# Altium integrated library SFMproject.IntLib: 182 symbols (continued)
## CP2110-F01-GMR (continued)
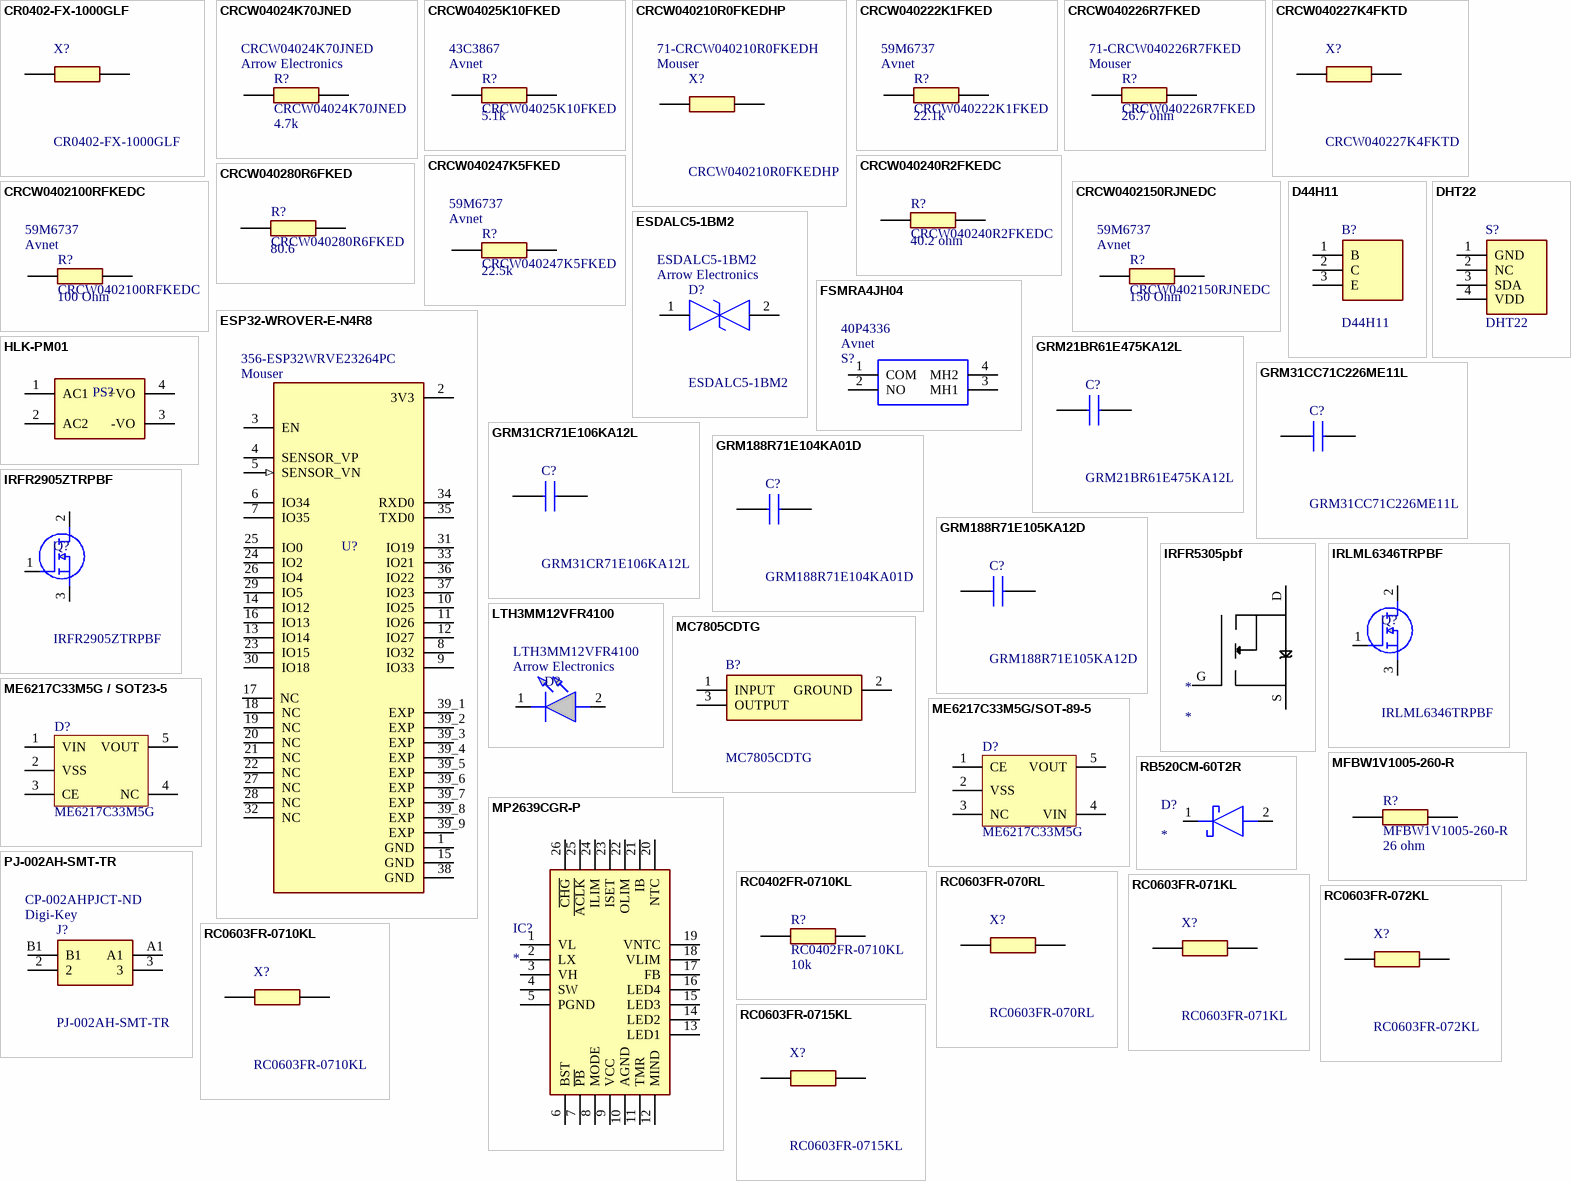
[diagram p3: symbols CR0402-FX-1000GLF to RC0603FR-0715KL]

## CR0402-FX-1000GLF
designator X?
SMD 0402 thick film resistor 100R 1% Bourns CR0402 Series Thick Film Resistor 0402 Case 100 +/-1% 0.0625W +/-100ppm/C; Geometry.Height: 0.4mm; Mouser Part Number: 652-CR0402FX-1000GLF; Mouser Price/Stock: https://www.mouser.co.uk/ProductDetail/Bourns/CR0402-FX-1000GLF?qs=URDPQ%2Fj0cz04RhAdmECPqw%3D%3D; Manufacturer_Name: Bourns; Manufacturer_Part_Number: CR0402-FX-1000GLF; Datasheet Link: https://www.bourns.com/pdfs/CR0402.pdf
footprint RESC1005X40N
pins: 1, 2

## CRCW04024K70JNED
designator R?  value 4.7k  Supplier 1: Arrow Electronics
VISHAY - CRCW04024K70JNED - RES, THICK FILM, 4K7, 5%, 0.063W, 0402; Geometry.Height: 0.4mm; Mouser Part Number: 71-CRCW0402J-4.7K-E3; Mouser Price/Stock: https://www.mouser.co.uk/ProductDetail/Vishay-Dale/CRCW04024K70JNED?qs=iWCWVRvNViwY%252BotGHUbALg%3D%3D; Manufacturer_Name: Vishay; Manufacturer_Part_Number: CRCW04024K70JNED; Datasheet Link: http://www.vishay.com/docs/20035/dcrcwe3.pdf; Supplier Part Number 1: CRCW04024K70JNED
footprint RESC1005X40N
pins: 1, 2

## CRCW04025K10FKED
designator R?  value 5.1k  Supplier 1: Avnet  Supplier Part Number 1: 43C3867
Thick Film Resistors - SMD 3/4watt 5.1Kohms 5%; Manufacturer_Name: Vishay; Geometry.Height: 0.4mm; Mouser Part Number: 71-CRCW0402-5.1K-E3; Mouser Price/Stock: https://www.mouser.co.uk/ProductDetail/Vishay-Dale/CRCW04024K70JNED?qs=iWCWVRvNViwY%252BotGHUbALg%3D%3D; Manufacturer_Part_Number: CRCW04025K10FKED; Datasheet Link: http://www.vishay.com/docs/20035/dcrcwe3.pdf
footprint RESC1005X40N
pins: 1, 2

## CRCW040210R0FKEDHP
designator X?  Supplier 1: Mouser  Supplier Part Number 1: 71-CRCW040210R0FKEDH
Résistances à couches épaisses - CMS 0.2W 10ohms 1% High Power AEC-Q200; Manufacturer_Name: Vishay; Geometry.Height: 0.4mm; Mouser Part Number: 71-CRCW040210R0FKEDH; Mouser Price/Stock: https://www.mouser.co.uk/ProductDetail/Vishay-Dale/CRCW040227K4FKTD?qs=r5im4gEiTnFagxYI2ivMOg%3D%3D; Manufacturer_Part_Number: CRCW040210R0FKEDHP; Datasheet Link: http://www.vishay.com/docs/20035/dcrcwe3.pdf
footprint RESC1005X40N
pins: 1, 2

## CRCW040222K1FKED
designator R?  value 22.1k  Supplier 1: Avnet  Supplier Part Number 1: 59M6737
Résistances à couches épaisses - CMS 1/16watt 22.1Kohms 1%; Manufacturer_Name: Vishay; Geometry.Height: 0.4mm; Mouser Part Number: 71-CRCW0402-22.1K-E3; Mouser Price/Stock: https://www.mouser.co.uk/ProductDetail/Vishay-Dale/CRCW04024K70JNED?qs=iWCWVRvNViwY%252BotGHUbALg%3D%3D; Manufacturer_Part_Number: CRCW040222K1FKED; Datasheet Link: http://www.vishay.com/docs/20035/dcrcwe3.pdf
footprint RESC1005X40N
pins: 1, 2

## CRCW040226R7FKED
designator R?  value 26.7 ohm  Supplier 1: Mouser  Supplier Part Number 1: 71-CRCW040226R7FKED
Thick Film Resistors - SMD 1/16watt 150ohms 5%; Manufacturer_Name: Vishay; Geometry.Height: 0.4mm; Mouser Part Number: 71-CRCW040226R7FKED; Mouser Price/Stock: https://www.mouser.fr/ProductDetail/Vishay-Dale/CRCW040226R7FKED?qs=pJv6fvR3AJyARSnZuzqe6g%3D%3D; Manufacturer_Part_Number: CRCW040226R7FKED; Datasheet Link: http://www.vishay.com/docs/20035/dcrcwe3.pdf
footprint RESC1005X40N
pins: 1, 2

## CRCW040227K4FKTD
designator X?
Thick Film Resistors - SMD 1/16watt 27.4Kohms 1%; Manufacturer_Name: Vishay; Geometry.Height: 0.4mm; Mouser Part Number: 71-CRCW0402-27.4K; Mouser Price/Stock: https://www.mouser.co.uk/ProductDetail/Vishay-Dale/CRCW040227K4FKTD?qs=r5im4gEiTnFagxYI2ivMOg%3D%3D; Manufacturer_Part_Number: CRCW040227K4FKTD; Datasheet Link: http://www.vishay.com/docs/20035/dcrcwe3.pdf
footprint RESC1005X40N
pins: 1, 2

## CRCW040240R2FKEDC
designator R?  value 40.2 ohm
Résistances à couches épaisses - CMS 1/16watt 40.2ohms 1% Commercial Use; Manufacturer_Name: Vishay; Geometry.Height: 0.4mm; Mouser Part Number: 71-CRCW040240R2FKEDC; Mouser Price/Stock: https://www.mouser.co.uk/ProductDetail/Vishay-Dale/CRCW04024K70JNED?qs=iWCWVRvNViwY%252BotGHUbALg%3D%3D; Manufacturer_Part_Number: CRCW040240R2FKEDC; Datasheet Link: http://www.vishay.com/docs/20035/dcrcwe3.pdf; Supplier 1: Avnet; Supplier Part Number 1: 59M6737
footprint RESC1005X40N
pins: 1, 2

## CRCW040247K5FKED
designator R?  value 22.5k  Supplier 1: Avnet  Supplier Part Number 1: 59M6737
Résistances à couches épaisses - CMS 1/16watt 47.5Kohms 1%; Manufacturer_Name: Vishay; Geometry.Height: 0.4mm; Mouser Part Number: 71-CRCW0402-47.5K-E3; Mouser Price/Stock: https://www.mouser.co.uk/ProductDetail/Vishay-Dale/CRCW04024K70JNED?qs=iWCWVRvNViwY%252BotGHUbALg%3D%3D; Manufacturer_Part_Number: CRCW040247K5FKED; Datasheet Link: http://www.vishay.com/docs/20035/dcrcwe3.pdf
footprint RESC1005X40N
pins: 1, 2

## CRCW040280R6FKED
designator R?  value 80.6
Résistances à couches épaisses - CMS 1/16watt 80.6ohms 1%; Manufacturer_Name: Vishay; Geometry.Height: 0.4mm; Mouser Part Number: 71-CRCW0402-80.6-E3; Mouser Price/Stock: https://www.mouser.co.uk/ProductDetail/Vishay-Dale/CRCW04024K70JNED?qs=iWCWVRvNViwY%252BotGHUbALg%3D%3D; Manufacturer_Part_Number: CRCW040280R6FKED; Datasheet Link: http://www.vishay.com/docs/20035/dcrcwe3.pdf; Supplier 1: Avnet; Supplier Part Number 1: 59M6737
footprint RESC1005X40N
pins: 1, 2

## CRCW0402100RFKEDC
designator R?  value 100 Ohm  Supplier 1: Avnet  Supplier Part Number 1: 59M6737
Résistances à couches épaisses - CMS 1/16watt 100ohms 1% Commercial Use; Manufacturer_Name: Vishay; Geometry.Height: 0.4mm; Mouser Part Number: 71-CRCW0402100RFKEDC; Mouser Price/Stock: https://www.mouser.co.uk/ProductDetail/Vishay-Dale/CRCW04024K70JNED?qs=iWCWVRvNViwY%252BotGHUbALg%3D%3D; Manufacturer_Part_Number: CRCW0402100RFKEDC; Datasheet Link: http://www.vishay.com/docs/20035/dcrcwe3.pdf
footprint RESC1005X40N
pins: 1, 2

## CRCW0402150RJNEDC
designator R?  value 150 Ohm  Supplier 1: Avnet  Supplier Part Number 1: 59M6737
Thick Film Resistors - SMD 1/16watt 150ohms 5%; Manufacturer_Name: Vishay; Geometry.Height: 0.4mm; Mouser Part Number: 71-CRCW0402150RJNEDC; Mouser Price/Stock: https://www.mouser.co.uk/ProductDetail/Vishay-Dale/CRCW04024K70JNED?qs=iWCWVRvNViwY%252BotGHUbALg%3D%3D; Manufacturer_Part_Number: CRCW0402150RJNEDC; Datasheet Link: http://www.vishay.com/docs/20035/dcrcwe3.pdf
footprint RESC1005X40N
pins: 1, 2

## D44H11
designator B?
D44H11, NPN Bipolar Transistor,  20 A 80 V HFE:40 Power, 3-Pin TO-220; Manufacturer_Name: STMicroelectronics; Geometry.Height: 4.6mm; Mouser Part Number: 511-D44H11; Mouser Price/Stock: https://www.mouser.co.uk/ProductDetail/STMicroelectronics/D44H11?qs=ljbEvF4DwOODgMo8k6UOWA%3D%3D; Manufacturer_Part_Number: D44H11; Datasheet Link: http://www.st.com/web/en/resource/technical/document/datasheet/CD00000942.pdf
footprint TO270P460X1020X2008-3P
pins: 1 B, 2 C, 3 E

## DHT22
designator S?
DHT22 Temp / Humidity Sensor; Manufacturer_Name: Amphenol Communication Solutions; Manufacturer_Part_Number: 83-17985; Geometry.Height: 8.58mm; Mouser Part Number: 83-17985; Mouser Price/Stock: https://www.mouser.co.uk/ProductDetail/Amphenol-FCI/54101-S0803LF?qs=iiM6sTJtPEc921tw16XaKg%3D%3D; Datasheet Link: https://cdn.amphenol-cs.com/media/wysiwyg/files/drawing/54101.pdf
footprint dht22
pins: 1 GND, 2 NC, 3 SDA, 4 VDD

## ESDALC5-1BM2
designator D?  Supplier 1: Arrow Electronics
Clamp - Ipp Tvs Diode Surface Mount SOD-882, 5V, 150W, -55C~150C; Manufacturer_Name: STMicroelectronics; Geometry.Height: 0.5mm; Mouser Part Number: 511-ESDALC5-1BM2; Mouser Price/Stock: https://www.mouser.co.uk/ProductDetail/STMicroelectronics/ESDALC5-1BM2?qs=z0iXaKah%2FHD83bi3LWB72A%3D%3D; Manufacturer_Part_Number: ESDALC5-1BM2; Datasheet Link: https://www.st.com/resource/en/datasheet/esdalc5-1bm2.pdf; Supplier Part Number 1: ESDALC5-1BM2
footprint ESDALC51BM2
pins: 1, 2

## ESP32-WROVER-E-N4R8
designator U?  Supplier 1: Mouser  Supplier Part Number 1: 356-ESP32WRVE23264PC
Bluetooth, WiFi 802.11b/g/n, Bluetooth v4.2 +EDR Transceiver Module 2.4GHz ~ 2.5GHz PCB Trace Surface Mount; MF: Espressif Systems; MP: ESP32WROVEREN4R8; SnapEDA_Link: https://www.snapeda.com/parts/ESP32WROVEREN4R8/Espressif+Systems/view-part/?ref=snap; Price: None; Check_prices: https://www.snapeda.com/parts/ESP32WROVEREN4R8/Espressif+Systems/view-part/?ref=eda; Value: *; Package: None; Availability: In Stock; Purchase-URL: https://pricing.snapeda.com/search/part/ESP32WROVEREN4R8/?ref=eda
footprint XCVR_ESP32-WROVER-E-N4R8
pins: 1 GND (power), 2 3V3 (power), 3 EN, 4 SENSOR_VP, 5 SENSOR_VN (in), 6 IO34, 7 IO35, 8 IO32, 9 IO33, 10 IO25, 11 IO26, 12 IO27, 13 IO14, 14 IO12, 15 GND (power), 16 IO13, 17 NC, 18 NC, 19 NC, 20 NC, 21 NC, 22 NC, 23 IO15, 24 IO2, 25 IO0, 26 IO4, 27 NC, 28 NC, 29 IO5, 30 IO18, 31 IO19, 32 NC, 33 IO21, 34 RXD0, 35 TXD0, 36 IO22, 37 IO23, 38 GND (power), 39_1 EXP (power), 39_2 EXP (power), 39_3 EXP (power), 39_4 EXP (power), 39_5 EXP (power), 39_6 EXP (power), 39_7 EXP (power), 39_8 EXP (power), 39_9 EXP (power)

## FSMRA4JH04
designator S?  Supplier 1: Avnet  Supplier Part Number 1: 40P4336  (hidden comment: *)
Switch, Pushbutton, Tactile, Single Pole, 50mA, Right Angle; MP: FSMRA4JH04; MF: TE Connectivity; Package: None; Purchase-URL: https://pricing.snapeda.com/search/part/FSMRA4JH04/?ref=eda; Check_prices: https://www.snapeda.com/parts/FSMRA4JH04/TE%20Connectivity/view-part/45679/?ref=eda; Availability: Good; Price: None; SnapEDA_Link: https://www.snapeda.com/parts/FSMRA4JH04/TE%20Connectivity/view-part/45679/?ref=snap; Value: *
footprint FSMRA4JH04
pins: 1 COM, 2 NO, 3 MH1, 4 MH2

## GRM21BR61E475KA12L
designator C?
MURATA - GRM21BR61E475KA12L - CAP, MLCC, X5R, 4.7UF, 25V, 0805; Manufacturer_Name: Murata Electronics; Geometry.Height: 1.45mm; Mouser Part Number: 81-GRM21BR61E475KA12; Mouser Price/Stock: https://www.mouser.co.uk/ProductDetail/Murata-Electronics/GRM21BR61E475KA12L?qs=0E7Ycue1i8A0OYXyRL9B%252Bw%3D%3D; Manufacturer_Part_Number: GRM21BR61E475KA12L; Datasheet Link: http://www.murata.com/~/media/webrenewal/support/library/catalog/products/capacitor/mlcc/c02e.pdf
footprint CAPC2012X145N
pins: 1, 2

## GRM31CC71C226ME11L
designator C?
Capacitor GRM31_0.30 L=3.2mm W=1.6mm T=1.6mm; Manufacturer_Name: Murata Electronics; Geometry.Height: 1.8mm; Mouser Part Number: 81-GRM31CC71C226ME1L; Mouser Price/Stock: https://www.mouser.co.uk/ProductDetail/Murata-Electronics/GRM31CC71C226ME11L?qs=84nSAGdh8NWdrdZkWAT5Sg%3D%3D; Manufacturer_Part_Number: GRM31CC71C226ME11L; Datasheet Link: http://www.murata.com/~/media/webrenewal/support/library/catalog/products/capacitor/mlcc/c02e.pdf
footprint CAPC3216X180N
pins: 1, 2

## GRM31CR71E106KA12L
designator C?
Multilayer Ceramic Capacitors MLCC - SMD/SMT 10uF 25Volts 10%; Manufacturer_Name: Murata Electronics; Geometry.Height: 1.8mm; Mouser Part Number: 81-GRM31CR71E106KA12; Mouser Price/Stock: https://www.mouser.co.uk/ProductDetail/Murata-Electronics/GRM31CR71E106KA12L?qs=WYkmdVEdyYZYvAEW1b%252BVEA%3D%3D; Manufacturer_Part_Number: GRM31CR71E106KA12L; Datasheet Link: http://www.murata.com/~/media/webrenewal/support/library/catalog/products/capacitor/mlcc/c02e.pdf
footprint CAPC3216X180N
pins: 1, 2

## GRM188R71E104KA01D
designator C?
Ceramic  SMT capacitor 100nF 25Vdc Murata 0603 GRM 1uF Ceramic Multilayer Capacitor, 25 V dc, +125degC, X7R Dielectric,  /-10%; Manufacturer_Name: Murata Electronics; Manufacturer_Part_Number: GRM188R71E105KA12D; Geometry.Height: 0.9mm; Mouser Part Number: 81-GRM188R71E105KA2D; Mouser Price/Stock: https://www.mouser.co.uk/ProductDetail/Murata-Electronics/GRM188R71E105KA12D?qs=62qOe8%2Fl8sHaxJyNXtrK%2FQ%3D%3D; Datasheet Link: https://datasheet.datasheetarchive.com/originals/distributors/Datasheets_SAMA/ec4f1577dddcc7a13ddad897a28002d3.pdf
footprint CAPC1608X90N
pins: 1, 2

## GRM188R71E105KA12D
designator C?
Ceramic  SMT capacitor 1uF 25Vdc Murata 0603 GRM 1uF Ceramic Multilayer Capacitor, 25 V dc, +125degC, X7R Dielectric,  /-10%; Manufacturer_Name: Murata Electronics; Geometry.Height: 0.9mm; Mouser Part Number: 81-GRM188R71E105KA2D; Mouser Price/Stock: https://www.mouser.co.uk/ProductDetail/Murata-Electronics/GRM188R71E105KA12D?qs=62qOe8%2Fl8sHaxJyNXtrK%2FQ%3D%3D; Manufacturer_Part_Number: GRM188R71E105KA12D; Datasheet Link: https://datasheet.datasheetarchive.com/originals/distributors/Datasheets_SAMA/ec4f1577dddcc7a13ddad897a28002d3.pdf
footprint CAPC1608X90N
pins: 1, 2

## HLK-PM01
designator PS?  (value not drawn)
The HLK-PM01 is a small size low cost AC to DC converter which can take in 110V/220V AC at 50/60 Hz and give 5V 3W output. The module is can be used in designs which run on 5V and needs to be powered form the AC mains.; MF: Hi-link; Package: None; Value: *; Price: None; Check_prices: https://www.snapeda.com/parts/hlk-pm01/Hi-link/view-part/?ref=eda; MP: hlk-pm01; Availability: Not in stock; SnapEDA_Link: https://www.snapeda.com/parts/hlk-pm01/Hi-link/view-part/?ref=snap
footprint CONV_HLK-PM01
pins: 1 AC1, 2 AC2, 3 -VO, 4 +VO

## IRFR2905ZTRPBF
designator Q?
MOSFET 55V 1 N-CH HEXFET 14.5mOhms 29nC; Manufacturer_Name: Infineon; Geometry.Height: 2.52mm; Mouser Part Number: 942-IRFR2905ZTRPBF; Mouser Price/Stock: https://www.mouser.co.uk/ProductDetail/Infineon-IR/IRFR2905ZTRPBF?qs=Z8%252BeY1k3TIIasKM0WUX9RA%3D%3D; Manufacturer_Part_Number: IRFR2905ZTRPBF; Datasheet Link: https://www.infineon.com/dgdl/irfr2905zpbf.pdf?fileId=5546d462533600a401535630e7222088
footprint IRFR2905ZTRPBF
pins: 1 G, 2 D, 3 S

## IRFR5305pbf
designator *
footprint DPAK228P970X238-3N (D-PAK, 3-Pads, Body 6.20x6.72mm (max), IPC Medium Density)
pins: D, G, S

## IRLML6346TRPBF
designator Q?
MOSFET MOSFT 3.4A 63mOhm 30V 2.5V drv capable; Manufacturer_Name: Infineon; Manufacturer_Part_Number: IRFR2905ZTRPBF; Geometry.Height: 2.52mm; Mouser Part Number: 942-IRLML6346TRPBF; Mouser Price/Stock: https://www.mouser.co.uk/ProductDetail/Infineon-IR/IRFR2905ZTRPBF?qs=Z8%252BeY1k3TIIasKM0WUX9RA%3D%3D; Datasheet Link: https://www.infineon.com/dgdl/irfr2905zpbf.pdf?fileId=5546d462533600a401535630e7222088
footprint SOT95P237X112-3N
pins: 1 G, 2 D, 3 S

## LTH3MM12VFR4100
designator D?  Supplier 1: Arrow Electronics  (hidden comment: LTH3MM12VFR4100)
Standard LEDs - Through Hole 3mm Thru Hole LED 625nm for 12VDC; Manufacturer_Name: Visual Communications Company; Geometry.Height: 6.3mm; Mouser Part Number: 593-LTH3MM12VFR4100; Mouser Price/Stock: https://www.mouser.co.uk/ProductDetail/VCC/LTH3MM12VFR4100?qs=Mv7BduZupUhznjtoVCBbVQ%3D%3D; Manufacturer_Part_Number: LTH3MM12VFR4100; Datasheet Link: https://vcclite.com/wp-content/uploads/wpallimport/files/files/LTH3MM12VFR4100.pdf; Supplier Part Number 1: LTH3MM12VFR4100
footprint LTH3MM12VFR4100
pins: 1 K, 2 A

## MC7805CDTG
designator B?
Linear Voltage Regulators 5V 1A Positive; Manufacturer_Name: onsemi; Geometry.Height: 2.51mm; Mouser Part Number: 863-MC7805CDTG; Mouser Price/Stock: https://www.mouser.co.uk/ProductDetail/onsemi/MC7805CDTG?qs=%252B9%2Fcbd0IE0RdeBGvK4GFRg%3D%3D; Manufacturer_Part_Number: MC7805CDTG; Datasheet Link: https://www.onsemi.com/pdf/datasheet/mc7800-d.pdf
footprint MC7805CDTG
pins: 1 INPUT, 2 GROUND, 3 OUTPUT

## ME6217C33M5G / SOT23-5
designator D?, comment ME6217C33M5G
footprint SOT-23-5_L2.9-W1.6-P0.95-LS2.8-BR
pins: 1 VIN, 2 VSS, 3 CE, 4 NC, 5 VOUT

## ME6217C33M5G/SOT-89-5
designator D?, comment ME6217C33M5G
footprint SOT89-150P410X160-5N (SOT89, 3-Leads, Body 4.50x2.45mm, Pitch 1.50mm, Lead Span 4.1mm, IPC Medium Density)
pins: 1 CE, 2 VSS, 3 NC, 4 VIN, 5 VOUT

## MFBW1V1005-260-R
designator R?  value 26 ohm
Perles de ferrite Multi Nor Cur, Impedance 26Ohm 700mA SMT; Manufacturer_Name: Eaton; Geometry.Height: 0.4mm; Mouser Part Number: MFBW1V1005-260-R; Mouser Price/Stock: https://www.mouser.fr/ProductDetail/Coiltronics-Eaton/MFBW1V1005-260-R?qs=sGAEpiMZZMukHu%252BjC5l7YaPBlkOlUGGIqfJa4l42TDs%3D; Manufacturer_Part_Number: MFBW1V1005-260-R; Datasheet Link: http://www.vishay.com/docs/20035/dcrcwe3.pdf
footprint RESC1005X40N
pins: 1, 2

## MP2639CGR-P
designator IC?
Integrated Circuit; Manufacturer_Name: Monolithic Power Systems (MPS); Manufacturer_Part_Number: MP2639AGR-Z; Datasheet Link: http://www.monolithicpower.com/pub/media/document/MP2639A_r1.0.pdf; Height: 1mm; Mouser Part Number: 946-MP2639AGR-Z; Mouser Price/Stock: https://www.mouser.co.uk/ProductDetail/Monolithic-Power-Systems-MPS/MP2639AGR-Z?qs=YCa%2FAAYMW004W5DDRZSXeQ%3D%3D
footprint MP2639AGRZ
pins: 1 VL, 2 LX, 3 VH, 4 SW, 5 PGND, 6 BST, 7 ~{PB}, 8 MODE, 9 VCC, 10 AGND, 11 TMR, 12 MIND, 13 LED1, 14 LED2, 15 LED3, 16 LED4, 17 FB, 18 VLIM, 19 VNTC, 20 NTC, 21 IB, 22 OLIM, 23 ISET, 24 ILIM, 25 ~{ACLK}, 26 ~{CHG}

## PJ-002AH-SMT-TR
designator J?  Supplier 1: Digi-Key  Supplier Part Number 1: CP-002AHPJCT-ND
DC Power Connectors Power Jacks; Manufacturer_Name: CUI Devices; Geometry.Height: 11.23mm; Mouser Part Number: 490-PJ-002AH-SMT-TR; Mouser Price/Stock: https://www.mouser.co.uk/ProductDetail/CUI-Devices/PJ-002AH-SMT-TR?qs=WyjlAZoYn52i5LSWfoFS9w%3D%3D; Manufacturer_Part_Number: PJ-002AH-SMT-TR; Datasheet Link: https://www.cuidevices.com/product/resource/pj-002ah-smt-tr.pdf
footprint PJ002AHSMTTR
pins: 2, 3, A1, B1

## RB520CM-60T2R
designator D?
Schottky Diode; Manufacturer_Name: ROHM Semiconductor; Manufacturer_Part_Number: RB520CM-60T2R; Description: RB520CM Schottky Barrier Diode VMN2M; Datasheet Link: https://datasheet.datasheetarchive.com/originals/distributors/DKDS-18/356751.pdf; Height: 0.4mm; Mouser Part Number: 755-RB520CM-60T2R; Mouser Price/Stock: https://www.mouser.co.uk/ProductDetail/ROHM-Semiconductor/RB520CM-60T2R?qs=%2FKR40Cd6GUpWo9GUBmk4zQ%3D%3D
footprint 1SS400CSFHT2RA
pins: 1 K, 2 A

## RC0402FR-0710KL
designator R?  value 10k
Yageo 10k, 0402 (1005M) Thick Film SMD Resistor +/-1% 0.063W - RC0402FR-0710KL; Geometry.Height: 0.4mm; Mouser Part Number: 603-RC0402FR-0710KL; Mouser Price/Stock: https://www.mouser.co.uk/ProductDetail/YAGEO/RC0402FR-0710KL?qs=I1mnnYJTTsxUoNwrUsQExA%3D%3D; Manufacturer_Name: YAGEO; Manufacturer_Part_Number: RC0402FR-0710KL; Datasheet Link: https://componentsearchengine.com/Datasheets/2/RC0402FR-0710KL.pdf; Supplier Part Number 1: 7468275; Supplier 1: Future Electronics
footprint RESC1005X40N
pins: 1, 2

## RC0603FR-070RL
designator X?
0 kOhms +/-1% 0.1W, 1/10W Chip Resistor 0603 (1608 Metric) Moisture Resistant Thick Film; Manufacturer_Name: YAGEO; Manufacturer_Part_Number: RC0603FR-0727K4L; Geometry.Height: 0.55mm; Mouser Part Number: *; Mouser Price/Stock: *; Datasheet Link: https://www.yageo.com/upload/media/product/productsearch/datasheet/rchip/PYu-RC_Group_51_RoHS_L_12.pdf
footprint RESC1608X55N
pins: 1, 2

## RC0603FR-071KL
designator X?
1 kOhms +/-1% 0.1W, 1/10W Chip Resistor 0603 (1608 Metric) Moisture Resistant Thick Film; Manufacturer_Name: YAGEO; Manufacturer_Part_Number: RC0603FR-0727K4L; Geometry.Height: 0.55mm; Mouser Part Number: *; Mouser Price/Stock: *; Datasheet Link: https://www.yageo.com/upload/media/product/productsearch/datasheet/rchip/PYu-RC_Group_51_RoHS_L_12.pdf
footprint RESC1608X55N
pins: 1, 2

## RC0603FR-072KL
designator X?
2 kOhms +/-1% 0.1W, 1/10W Chip Resistor 0603 (1608 Metric) Moisture Resistant Thick Film; Manufacturer_Name: YAGEO; Manufacturer_Part_Number: RC0603FR-0727K4L; Geometry.Height: 0.55mm; Mouser Part Number: *; Mouser Price/Stock: *; Datasheet Link: https://www.yageo.com/upload/media/product/productsearch/datasheet/rchip/PYu-RC_Group_51_RoHS_L_12.pdf
footprint RESC1608X55N
pins: 1, 2

## RC0603FR-0710KL
designator X?
10 kOhms +/-1% 0.1W, 1/10W Chip Resistor 0603 (1608 Metric) Moisture Resistant Thick Film; Manufacturer_Name: YAGEO; Manufacturer_Part_Number: RC0603FR-0727K4L; Geometry.Height: 0.55mm; Mouser Part Number: *; Mouser Price/Stock: *; Datasheet Link: https://www.yageo.com/upload/media/product/productsearch/datasheet/rchip/PYu-RC_Group_51_RoHS_L_12.pdf
footprint RESC1608X55N
pins: 1, 2

## RC0603FR-0715KL
designator X?
15 kOhms +/-1% 0.1W, 1/10W Chip Resistor 0603 (1608 Metric) Moisture Resistant Thick Film; Manufacturer_Name: YAGEO; Manufacturer_Part_Number: RC0603FR-0727K4L; Geometry.Height: 0.55mm; Mouser Part Number: *; Mouser Price/Stock: *; Datasheet Link: https://www.yageo.com/upload/media/product/productsearch/datasheet/rchip/PYu-RC_Group_51_RoHS_L_12.pdf
footprint RESC1608X55N
pins: 1, 2

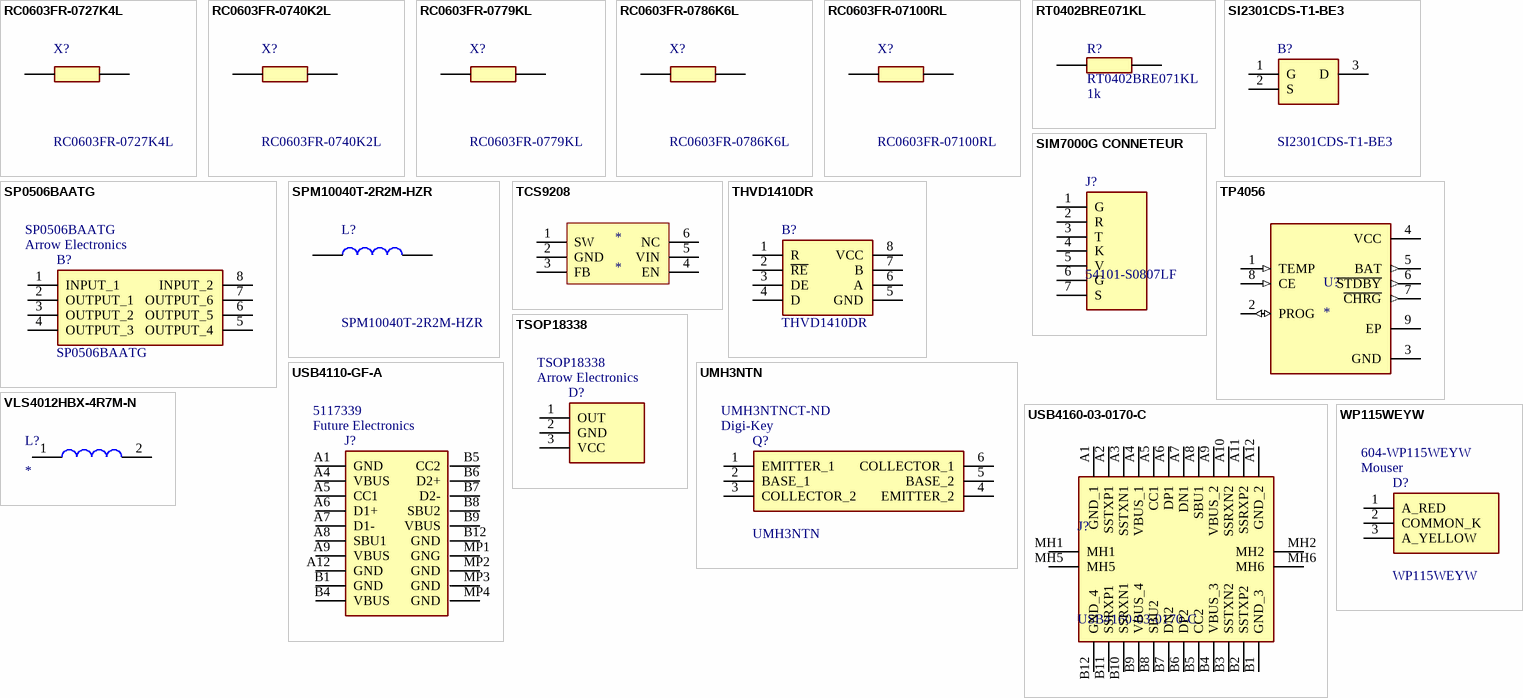
[diagram p4: symbols RC0603FR-0727K4L to WP115WEYW]

## RC0603FR-0727K4L
designator X?
27.4 kOhms +/-1% 0.1W, 1/10W Chip Resistor 0603 (1608 Metric) Moisture Resistant Thick Film; Manufacturer_Name: YAGEO; Geometry.Height: 0.55mm; Mouser Part Number: *; Mouser Price/Stock: *; Manufacturer_Part_Number: RC0603FR-0727K4L; Datasheet Link: https://www.yageo.com/upload/media/product/productsearch/datasheet/rchip/PYu-RC_Group_51_RoHS_L_12.pdf
footprint RESC1608X55N
pins: 1, 2

## RC0603FR-0740K2L
designator X?
40.2 kOhms +/-1% 0.1W, 1/10W Chip Resistor 0603 (1608 Metric) Moisture Resistant Thick Film; Manufacturer_Name: YAGEO; Manufacturer_Part_Number: RC0603FR-0727K4L; Geometry.Height: 0.55mm; Mouser Part Number: *; Mouser Price/Stock: *; Datasheet Link: https://www.yageo.com/upload/media/product/productsearch/datasheet/rchip/PYu-RC_Group_51_RoHS_L_12.pdf
footprint RESC1608X55N
pins: 1, 2

## RC0603FR-0779KL
designator X?
79 kOhms +/-1% 0.1W, 1/10W Chip Resistor 0603 (1608 Metric) Moisture Resistant Thick Film; Manufacturer_Name: YAGEO; Manufacturer_Part_Number: RC0603FR-0727K4L; Geometry.Height: 0.55mm; Mouser Part Number: *; Mouser Price/Stock: *; Datasheet Link: https://www.yageo.com/upload/media/product/productsearch/datasheet/rchip/PYu-RC_Group_51_RoHS_L_12.pdf
footprint RESC1608X55N
pins: 1, 2

## RC0603FR-0786K6L
designator X?
86.6 kOhms +/-1% 0.1W, 1/10W Chip Resistor 0603 (1608 Metric) Moisture Resistant Thick Film; Manufacturer_Name: YAGEO; Manufacturer_Part_Number: RC0603FR-0727K4L; Geometry.Height: 0.55mm; Mouser Part Number: *; Mouser Price/Stock: *; Datasheet Link: https://www.yageo.com/upload/media/product/productsearch/datasheet/rchip/PYu-RC_Group_51_RoHS_L_12.pdf
footprint RESC1608X55N
pins: 1, 2

## RC0603FR-07100RL
designator X?
100 Ohms +/-1% 0.1W, 1/10W Chip Resistor 0603 (1608 Metric) Moisture Resistant Thick Film; Manufacturer_Name: YAGEO; Manufacturer_Part_Number: RC0603FR-0727K4L; Geometry.Height: 0.55mm; Mouser Part Number: *; Mouser Price/Stock: *; Datasheet Link: https://www.yageo.com/upload/media/product/productsearch/datasheet/rchip/PYu-RC_Group_51_RoHS_L_12.pdf
footprint RESC1608X55N
pins: 1, 2

## RT0402BRE071KL
designator R?  value 1k
Thin Film Resistors - SMD 1/16W 1K ohm .1% 50ppm; Manufacturer_Name: YAGEO; Geometry.Height: 0.4mm; Mouser Part Number: 603-RT0402BRE071KL; Mouser Price/Stock: https://www.mouser.co.uk/ProductDetail/YAGEO/RC0402FR-0710KL?qs=I1mnnYJTTsxUoNwrUsQExA%3D%3D; Manufacturer_Part_Number: RT0402BRE071KL; Datasheet Link: https://componentsearchengine.com/Datasheets/2/RC0402FR-0710KL.pdf; Supplier 1: Future Electronics; Supplier Part Number 1: 3025706
footprint RESC1005X40N
pins: 1, 2

## SI2301CDS-T1-BE3
designator B?
MOSFET P-CHANNEL 20-V (D-S); Manufacturer_Name: Vishay; Geometry.Height: 1.12mm; Mouser Part Number: 78-SI2301CDS-T1-BE3; Mouser Price/Stock: https://www.mouser.co.uk/ProductDetail/Vishay-Siliconix/SI2301CDS-T1-BE3?qs=CiayqK2gdcJNFARNd%252BC6jg%3D%3D; Manufacturer_Part_Number: SI2301CDS-T1-BE3; Datasheet Link: https://www.arrow.com/en/products/si2301cds-t1-be3/vishay?region=nac
footprint SOT95P237X112-3N
pins: 1 G, 2 S, 3 D

## SIM7000G CONNETEUR
designator J?, comment 54101-S0807LF
BergStik, Board to Board connector, Unshrouded vertical Header, Through Hole, Single Row, 6 Positions, 2.54 mm Pitch.; Manufacturer_Name: Amphenol Communication Solutions; Geometry.Height: 8.58mm; Mouser Part Number: 649-54101-S0807LF; Mouser Price/Stock: https://www.mouser.co.uk/ProductDetail/Amphenol-FCI/54101-S0803LF?qs=iiM6sTJtPEc921tw16XaKg%3D%3D; Manufacturer_Part_Number: 54101-S0807LF; Datasheet Link: https://cdn.amphenol-cs.com/media/wysiwyg/files/drawing/54101.pdf
footprint 54101S0807LF
pins: 1 G, 2 R, 3 T, 4 K, 5 V, 6 G, 7 S

## SP0506BAATG
designator B?  Supplier 1: Arrow Electronics
TVS Diode Arrays; Manufacturer_Name: LITTELFUSE; Geometry.Height: 1.17mm; Mouser Part Number: 576-SP0506BAATG; Mouser Price/Stock: https://www.mouser.co.uk/ProductDetail/Littelfuse/SP0506BAATG?qs=RnOBYWd%2Fz7c6KTUitxDieg%3D%3D; Manufacturer_Part_Number: SP0506BAATG; Datasheet Link: https://www.littelfuse.com/~/media/electronics/datasheets/tvs_diode_arrays/littelfuse_tvs_diode_array_sp05_datasheet.pdf.pdf; Supplier Part Number 1: SP0506BAATG
footprint SOP65P488X117-8N
pins: 1 INPUT_1, 2 OUTPUT_1, 3 OUTPUT_2, 4 OUTPUT_3, 5 OUTPUT_4, 6 OUTPUT_5, 7 OUTPUT_6, 8 INPUT_2

## SPM10040T-2R2M-HZR
designator L?
Power Inductors - SMD 2.2uH 20% 7.46mOhms AEC-Q200; Manufacturer_Name: TDK; Geometry.Height: 4mm; Mouser Part Number: 810-SPM100402R2MHZR; Mouser Price/Stock: https://www.mouser.co.uk/ProductDetail/TDK/SPM10040T-2R2M-HZR?qs=amGC7iS6iy9pLpveIpRC3Q%3D%3D; Manufacturer_Part_Number: SPM10040T-2R2M-HZR; Datasheet Link: https://product.tdk.com/system/files/dam/doc/product/inductor/inductor/smd/catalog/inductor_automotive_power_spm10040-hzr_en.pdf
footprint SPM10040T2R2MHZR
pins: 1, 2

## TCS9208
designator *
footprint SOT95P245X110-6N (SOT23, 6-Leads, Body 2.90x2.45mm, Pitch 0.95mm, IPC Medium Density)
pins: 1 SW, 2 GND, 3 FB, 4 EN, 5 VIN, 6 NC
